# Altium footprint library Connector.PcbLib: 231 footprints (part 15 of 15)
Each footprint in its own frame and in the unit in brackets; x right, y up, seen from the top. Pads: shape width x height; smd on the part's side, far side on the other; paste and mask are expansions set on the pad; w line width, h text height; cw(c..) or ccw(c..) is an arc to the next point about the centre after c.
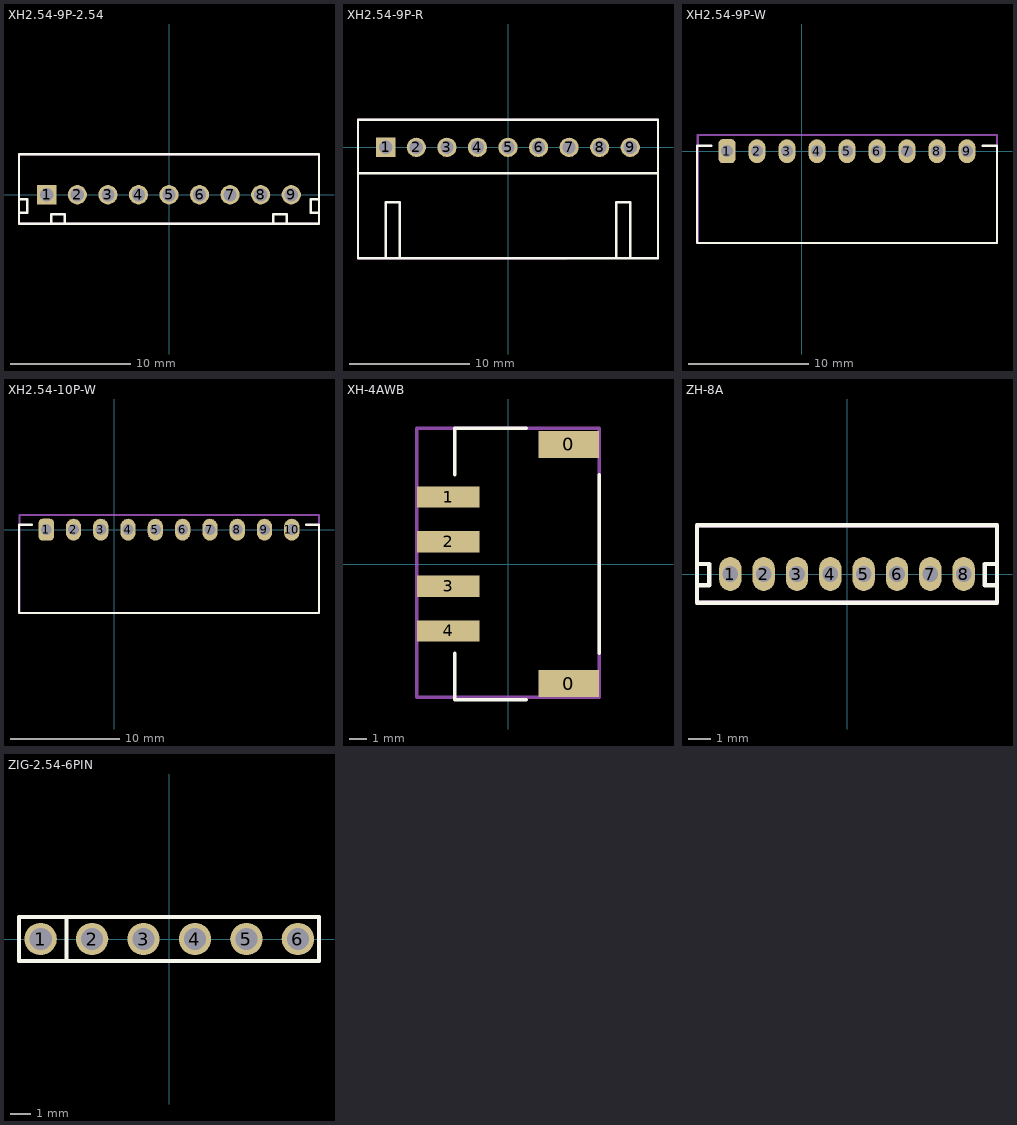
[diagram p14: the footprints below, top view; thin cyan lines are the x and y axes]

## XH2.54-9P-2.54 [mm]
pads (9):
  rect 1.6x1.6 hole 1.1: 1(-10.16,0)
  round 1.6 hole 1.1: 2(-7.62,0) 3(-5.08,0) 4(-2.54,0) 5(0,0) 6(2.54,0) 7(5.08,0) 8(7.62,0) 9(10.16,0)
Top Overlay:
  lines w0.2: -12.47,-1.5 -11.795,-1.5 -11.795,-0.375 -12.47,-0.375 ; -9.785,-2.31 -9.785,-1.635 -8.66,-1.635 -8.66,-2.31 ; 8.66,-2.31 8.66,-1.635 9.785,-1.635 9.785,-2.31 ; 12.47,-1.5 11.795,-1.5 11.795,-0.375 12.47,-0.375 ; -12.47,-2.4 12.47,-2.4 12.47,3.36 -12.47,3.36 -12.47,-2.4
Mechanical 13:
  lines w0.2: -12.47,-2.4 12.47,-2.4 12.47,3.36 -12.47,3.36 -12.47,-2.4
  text ".Designator" at -2.55,-0.342 h1.5
3D body "B9B-XH-A.STEP": height 7.1, standoff -3.3, extent -12.45,-2.375 12.45,3.375

## XH2.54-9P-R [mm]
pads (9):
  rect 1.6x1.6 hole 1.1: 1(-10.16,0)
  round 1.6 hole 1.1: 2(-7.62,0) 3(-5.08,0) 4(-2.54,0) 5(0,0) 6(2.54,0) 7(5.08,0) 8(7.62,0) 9(10.16,0)
Top Overlay:
  lines w0.2: -12.47,-2.15 12.465,-2.15 ; -10.16,-9.225 -10.16,-4.55 -9.01,-4.55 -9.01,-9.225 ; 9.01,-9.225 9.01,-4.55 10.16,-4.55 10.16,-9.225 ; -12.47,-9.225 -12.47,2.3 12.47,2.3 12.47,-9.225 -12.47,-9.225
Mechanical 13:
  lines w0.2: 4.85,-9.225 -12.47,-9.225 -12.47,2.3 12.47,2.3 12.47,-9.225
  text ".Designator" at -4.085,-4.367 h1.5
3D body "S9B-XH-A.STEP": height 6.17, standoff -3.37, extent -12.55,-9.275 12.35,2.225

## XH2.54-9P-W [mm]
pads (9):
  rrect50% 1.4x2 hole 1: 1(-6.25,0)
  oval 1.4x2 hole 1: 2(-3.75,0) 3(-1.25,0) 4(1.25,0) 5(3.75,0) 6(6.25,0) 7(8.75,0) 8(11.25,0) 9(13.75,0)
Top Overlay:
  lines w0.2: -7.55,0.44 -8.75,0.44 -8.75,-7.65 16.25,-7.65 16.25,0.44 15.05,0.44
Mechanical 13:
  lines w0.2: -8.7,-7.65 -8.7,1.35 16.25,1.35 16.25,-7.65 -8.7,-7.65
  text ".Designator" at -2.8,-3.947 h2
3D body "JST - XH - Thru (R) - 9Pin - 2.54mm.stp": height 5.84, standoff -3.38, extent -8.797,-7.809 16.197,0.228

## XH2.54-10P-W [mm]
pads (10):
  rrect50% 1.4x2 hole 1: 1(-6.25,0)
  oval 1.4x2 hole 1: 2(-3.75,0) 3(-1.25,0) 4(1.25,0) 5(3.75,0) 6(6.25,0) 7(8.75,0) 8(11.25,0) 9(13.75,0) 10(16.25,0)
Top Overlay:
  lines w0.2: -7.55,0.44 -8.75,0.44 -8.75,-7.65 18.75,-7.65 18.75,0.44 17.55,0.44
Mechanical 13:
  lines w0.2: -8.7,-7.65 18.75,-7.65 18.75,1.35 -8.7,1.35 -8.7,-7.65
  text ".Designator" at 0.7,-4.372 h2
3D body "JST - XH - Thru (R) - 10Pin - 2.54mm.stp": height 5.84, standoff -3.38, extent -8.784,-7.623 18.75,0.413

## XH-4AWB [mm]
pads (6):
  rect 3.4x1.5 smd: 0(3.375,-6.7) 0(3.375,6.7)
  rect 3.5x1.2 smd: 1(-3.375,3.75) 2(-3.375,1.25) 3(-3.375,-1.25) 4(-3.375,-3.75)
Top Overlay:
  lines w0.2: -3,-5 -3,-7.607 1,-7.607 ; -3,5 -3,7.607 1,7.607 ; 5.075,-5 5.075,5
Mechanical 13:
  lines w0.2: -5.125,-7.45 5.075,-7.45 5.075,7.607 -5.125,7.607 -5.125,-7.45
  text ".Designator" at -0.122,4.35 h2
3D body "JST - XH - SMD (R) - 4Pin - 2.54mm.stp": height 5.92, standoff 0, extent -4.831,-7.607 5.075,7.607

## ZH-8A [mm]
pads (8):
  oval 1x1.524 hole 0.7: 1(-5.25,0) 2(-3.75,0) 3(-2.25,0) 4(-0.75,0) 5(0.75,0) 6(2.25,0) 7(3.75,0) 8(5.25,0)
Top Overlay:
  lines w0.2: -6.75,-0.5 -6.2,-0.5 -6.2,0.45 -6.75,0.45 ; 6.75,-0.5 6.2,-0.5 6.2,0.45 6.75,0.45 ; -6.75,-1.3 -6.75,2.2 6.75,2.2 6.75,-1.3 -6.75,-1.3
Mechanical 13:
  lines w0.2: -6.75,-1.3 6.75,-1.3 6.75,2.2 -6.75,2.2 -6.75,-1.3
  text ".Designator" at -3.2,0.1 h1.5
3D body "B8B-ZR.STEP": height 4.5, standoff -2.7, extent -6.75,-1.3 6.75,2.2

## ZIG-2.54-6PIN [mm]
pads (6):
  round 1.6 hole 1.1: 1(-6.35,0) 2(-3.81,0) 3(-1.27,0) 4(1.27,0) 5(3.81,0) 6(6.35,0)
Top Overlay:
  lines w0.2: -5.08,-1.016 -5.08,1.016 ; -7.417,-1.092 7.391,-1.092 7.391,1.092 -7.417,1.092 -7.417,-1.092
Mechanical 13:
  lines w0.2: -7.417,-1.092 7.391,-1.092 7.391,1.092 -7.417,1.092 -7.417,-1.092
  text ".Designator" at -5.385,-0.305 h1.5
Mechanical 15:
  lines w0.2: -7.417,-1.092 -7.417,1.092 7.391,1.092 7.391,-1.092 -7.417,-1.092
  text ".Comment" at -5.969,-0.483 h1.5